# Altium footprint library other.PcbLib: 50 footprints (part 4 of 4)
Each footprint in its own frame and in the unit in brackets; x right, y up, seen from the top. Pads: shape width x height; smd on the part's side, far side on the other; paste and mask are expansions set on the pad; w line width, h text height; cw(c..) or ccw(c..) is an arc to the next point about the centre after c.
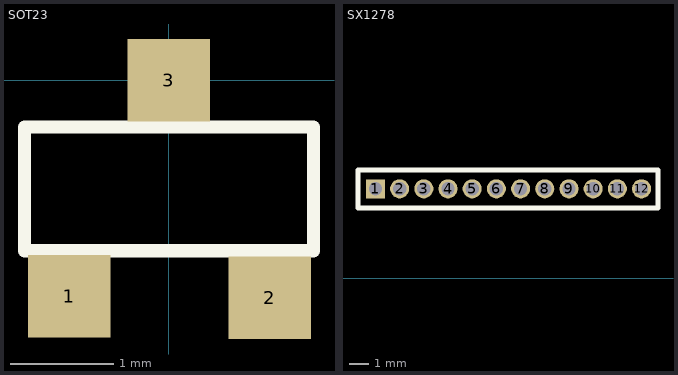
[diagram p3: the footprints below, top view; thin cyan lines are the x and y axes]

## SOT23 [mm]
pads (3):
  rect 0.8x0.8 smd: 1(-0.963,-2.093) 2(0.979,-2.105) 3(0,0)
Top Overlay:
  lines w0.127: -1.397,-1.651 1.403,-1.651 1.403,-0.451 -1.397,-0.451 -1.397,-1.651
3D body: height 1, standoff 0, extent -1.393,-1.639 1.394,-0.436

## SX1278 [mm]
pads (12):
  rect 1x1 hole 0.7: 1(4.369,4.699)
  round 1 hole 0.7: 2(5.639,4.699) 3(6.909,4.699) 4(8.179,4.699) 5(9.449,4.699) 6(10.719,4.699) 7(11.989,4.699) 8(13.259,4.699) 9(14.529,4.699) 10(15.799,4.699) 11(17.069,4.699) 12(18.339,4.699)
Top Overlay:
  lines w0.254: 3.454,3.69 3.454,5.69 19.202,5.69 19.202,3.69 3.454,3.69